# Altium footprint library 3M THD.PcbLib: 163 footprints (part 7 of 14) (continued)
## 3M_N3428-5202RB_a [mm] "3M, 3000 Series, 20 Contacts - Pitch 2.54mm - Right Angle Four-Wall Header (Black) With Short Roll Pin Latch/Ejectors" (continued)
Mechanical 14:
  circle w0.1: c-17.335,0.533 r1.27
  circle w0.1: c17.336,0.533 r1.27
  circle w0.1: c17.018,6.375 r0.787
  circle w0.1: c-17.018,6.375 r0.787
  lines w0.1: -19.837,-2.007 -19.837,1.978 -17.335,3.422 -14.833,1.978 -14.833,-2.007 ; -18.339,14.249 -18.339,22.024 -18.186,22.112 -13.081,19.164 -13.081,15.799 -13.182,15.697 -18.339,15.697 ; -15.113,14.757 -15.113,20.337 ; -12.694,11.201 -11.424,9.002 -10.887,9.931 ; -11.119,11.201 -11.119,9.931 -9.201,9.931 -9.207,11.201 ; -2.032,5.105 2.032,5.105 ; -2.032,11.201 -2.032,3.581 2.032,3.581 2.032,11.201 ; -1.587,5.105 -1.587,11.201 ; -0.952,5.105 -0.952,11.201 ; 0.953,5.105 0.953,11.201 ; 1.588,5.105 1.588,11.201 ; 6.668,11.201 6.661,9.931 8.579,9.931 8.573,11.201 ; 14.834,-2.007 14.834,1.978 17.336,3.422 19.838,1.978 19.838,-2.007 ; 15.12,20.342 15.137,14.757 ; 18.339,14.249 18.339,22.024 18.187,22.112 13.081,19.164 13.081,15.799 13.183,15.697 18.339,15.697 ; -22.352,-2.007 22.352,-2.007 22.352,5.105 19.024,14.249 18.182,14.249 cw(c17.018,14.757) 15.748,14.757 14.906,14.757 14.464,12.251 cw(c13.214,12.471) 13.214,11.201 -13.213,11.201 cw(c-13.213,12.471) -14.464,12.251 -14.906,14.757 -15.748,14.757 cw(c-17.018,14.757) -18.182,14.249 -19.024,14.249 -22.352,5.105 -22.352,-2.007
  text "1" at -13.462,-1.7 h1.02
  text "20" at 12.69,0.889 h1.02
3D body "3M_N3428-5202RB_a.stp": height 8.64, standoff -2.84, extent -22.352,-2.514 22.352,22.125

## 3M_N3428-5302RB [mm] "3M, 3000 Series, 20 Contacts - Pitch 2.54mm - Right Angle Four-Wall Header (Black) With Long Roll Pin Latch/Ejectors"
height 8.6
pads (22):
  round 1.6 hole 0.9: 1(-11.43,-1.27) 2(-11.43,1.27) 3(-8.89,-1.27) 4(-8.89,1.27) 5(-6.35,-1.27) 6(-6.35,1.27) 7(-3.81,-1.27) 8(-3.81,1.27) 9(-1.27,-1.27) 10(-1.27,1.27) 11(1.27,-1.27) 12(1.27,1.27) 13(3.81,-1.27) 14(3.81,1.27) 15(6.35,-1.27) 16(6.35,1.27) 17(8.89,-1.27) 18(8.89,1.27) 19(11.43,-1.27) 20(11.43,1.27)
  round 4.6 hole 2.8: MTG1(-17.335,0.533) MTG2(17.336,0.533)
Top Overlay:
  circle w0.2: c17.018,6.375 r0.787
  circle w0.2: c-17.018,6.375 r0.787
  circle w0.3: c-11.503,-3.048 r0.15
  lines w0.2: -30.354,16.275 -20.393,10.488 ; -27.949,11.162 -25.371,15.627 -25.408,15.766 -28.322,17.449 -33.428,14.501 -33.428,14.325 -24.241,9.02 -22.038,5.969 ; -19.24,-2.007 -22.352,-2.007 -22.352,5.105 -19.024,14.249 -18.182,14.249 ccw(c-17.018,14.757) -15.748,14.757 -14.906,14.757 -14.464,12.251 ccw(c-13.213,12.471) -13.213,11.201 13.213,11.201 ccw(c13.213,12.471) 14.464,12.251 14.906,14.757 15.748,14.757 ccw(c17.018,14.757) 18.182,14.249 19.024,14.249 22.352,5.105 22.352,-2.007 19.24,-2.007 ; -12.694,11.201 -11.424,9.002 -10.887,9.931 ; -11.119,11.201 -11.119,9.931 -9.201,9.931 -9.207,11.201 ; -2.032,5.105 2.032,5.105 ; -2.032,11.201 -2.032,3.581 2.032,3.581 2.032,11.201 ; -1.587,5.105 -1.587,11.201 ; -0.952,5.105 -0.952,11.201 ; 0.953,5.105 0.953,11.201 ; 1.588,5.105 1.588,11.201 ; 6.668,11.201 6.661,9.931 8.579,9.931 8.573,11.201 ; 20.393,10.488 30.354,16.275 ; 22.038,5.969 24.241,9.02 33.428,14.325 ; 27.949,11.162 25.371,15.627 25.408,15.766 28.322,17.449 33.428,14.501
  text "1" at -13.462,-1.7 h1.02
  text "20" at 12.69,0.889 h1.02
Mechanical 8:
  lines w0.1: -18.335,0.533 -17.335,0.533 ; -17.335,-0.467 -17.335,0.533 ; -17.335,1.533 -17.335,0.533 ; -16.335,0.533 -17.335,0.533 ; -12.43,-1.27 -11.43,-1.27 ; -12.43,1.27 -11.43,1.27 ; -11.43,-2.27 -11.43,-1.27 ; -11.43,-0.27 -11.43,-1.27 ; -11.43,0.27 -11.43,1.27 ; -11.43,2.27 -11.43,1.27 ; -10.43,-1.27 -11.43,-1.27 ; -10.43,1.27 -11.43,1.27 ; -9.89,-1.27 -8.89,-1.27 ; -9.89,1.27 -8.89,1.27 ; -8.89,-2.27 -8.89,-1.27 ; -8.89,-0.27 -8.89,-1.27 ; -8.89,0.27 -8.89,1.27 ; -8.89,2.27 -8.89,1.27 ; -7.89,-1.27 -8.89,-1.27 ; -7.89,1.27 -8.89,1.27 ; -7.35,-1.27 -6.35,-1.27 ; -7.35,1.27 -6.35,1.27 ; -6.35,-2.27 -6.35,-1.27 ; -6.35,-0.27 -6.35,-1.27 ; -6.35,0.27 -6.35,1.27 ; -6.35,2.27 -6.35,1.27 ; -5.35,-1.27 -6.35,-1.27 ; -5.35,1.27 -6.35,1.27 ; -4.81,-1.27 -3.81,-1.27 ; -4.81,1.27 -3.81,1.27 ; -3.81,-2.27 -3.81,-1.27 ; -3.81,-0.27 -3.81,-1.27 ; -3.81,0.27 -3.81,1.27 ; -3.81,2.27 -3.81,1.27 ; -2.81,-1.27 -3.81,-1.27 ; -2.81,1.27 -3.81,1.27 ; -2.27,-1.27 -1.27,-1.27 ; -2.27,1.27 -1.27,1.27 ; -1.27,-2.27 -1.27,-1.27 ; -1.27,-0.27 -1.27,-1.27 ; -1.27,0.27 -1.27,1.27 ; -1.27,2.27 -1.27,1.27 ; -1,0 0,0 ; -0.27,-1.27 -1.27,-1.27 ; -0.27,1.27 -1.27,1.27 ; 0,-1 0,0 ; 0,1 0,0 ; 0.27,-1.27 1.27,-1.27 ; 0.27,1.27 1.27,1.27 ; 1,0 0,0 ; 1.27,-2.27 1.27,-1.27 ; 1.27,-0.27 1.27,-1.27 ; 1.27,0.27 1.27,1.27 ; 1.27,2.27 1.27,1.27 ; 2.27,-1.27 1.27,-1.27 ; 2.27,1.27 1.27,1.27 ; 2.81,-1.27 3.81,-1.27 ; 2.81,1.27 3.81,1.27 ; 3.81,-2.27 3.81,-1.27 ; 3.81,-0.27 3.81,-1.27 ; 3.81,0.27 3.81,1.27 ; 3.81,2.27 3.81,1.27 ; 4.81,-1.27 3.81,-1.27 ; 4.81,1.27 3.81,1.27 ; 5.35,-1.27 6.35,-1.27 ; 5.35,1.27 6.35,1.27 ; 6.35,-2.27 6.35,-1.27 ; 6.35,-0.27 6.35,-1.27 ; 6.35,0.27 6.35,1.27 ; 6.35,2.27 6.35,1.27 ; 7.35,-1.27 6.35,-1.27 ; 7.35,1.27 6.35,1.27 ; 7.89,-1.27 8.89,-1.27 ; 7.89,1.27 8.89,1.27 ; 8.89,-2.27 8.89,-1.27 ; 8.89,-0.27 8.89,-1.27 ; 8.89,0.27 8.89,1.27 ; 8.89,2.27 8.89,1.27 ; 9.89,-1.27 8.89,-1.27 ; 9.89,1.27 8.89,1.27 ; 10.43,-1.27 11.43,-1.27 ; 10.43,1.27 11.43,1.27 ; 11.43,-2.27 11.43,-1.27 ; 11.43,-0.27 11.43,-1.27 ; 11.43,0.27 11.43,1.27 ; 11.43,2.27 11.43,1.27 ; 12.43,-1.27 11.43,-1.27 ; 12.43,1.27 11.43,1.27 ; 16.336,0.533 17.336,0.533 ; 17.336,-0.467 17.336,0.533 ; 17.336,1.533 17.336,0.533 ; 18.336,0.533 17.336,0.533
Mechanical 14:
  circle w0.1: c-17.335,0.533 r1.27
  circle w0.1: c17.336,0.533 r1.27
  circle w0.1: c17.018,6.375 r0.787
  circle w0.1: c-17.018,6.375 r0.787
  lines w0.1: -30.354,16.275 -20.393,10.488 ; -27.949,11.162 -25.371,15.627 -25.408,15.766 -28.322,17.449 -33.428,14.501 -33.428,14.325 -24.241,9.02 -22.038,5.969 ; -19.837,-2.007 -19.837,1.978 -17.335,3.422 -14.834,1.978 -14.834,-2.007 ; -12.694,11.201 -11.424,9.002 -10.887,9.931 ; -11.119,11.201 -11.119,9.931 -9.201,9.931 -9.207,11.201 ; -2.032,5.105 2.032,5.105 ; -2.032,11.201 -2.032,3.581 2.032,3.581 2.032,11.201 ; -1.587,5.105 -1.587,11.201 ; -0.952,5.105 -0.952,11.201 ; 0.953,5.105 0.953,11.201 ; 1.588,5.105 1.588,11.201 ; 6.668,11.201 6.661,9.931 8.579,9.931 8.573,11.201 ; 14.834,-2.007 14.834,1.978 17.336,3.422 19.837,1.978 19.837,-2.007 ; 20.393,10.488 30.354,16.275 ; 22.038,5.969 24.241,9.02 33.428,14.325 ; 27.949,11.162 25.371,15.627 25.408,15.766 28.322,17.449 33.428,14.501 ; -22.352,-2.007 22.352,-2.007 22.352,5.105 19.024,14.249 18.182,14.249 cw(c17.018,14.757) 15.748,14.757 14.906,14.757 14.464,12.251 cw(c13.213,12.471) 13.213,11.201 -13.213,11.201 cw(c-13.213,12.471) -14.464,12.251 -14.906,14.757 -15.748,14.757 cw(c-17.018,14.757) -18.182,14.249 -19.024,14.249 -22.352,5.105 -22.352,-2.007
  text "1" at -13.462,-1.7 h1.02
  text "20" at 12.69,0.889 h1.02
3D body "3M_N3428-5302RB.stp": height 8.64, standoff -2.84, extent -33.478,-2.514 33.479,17.448

## 3M_N3428-5302RB_a [mm] "3M, 3000 Series, 20 Contacts - Pitch 2.54mm - Right Angle Four-Wall Header (Black) With Long Roll Pin Latch/Ejectors"
height 8.6
pads (22):
  round 1.6 hole 0.9: 1(-11.43,-1.27) 2(-11.43,1.27) 3(-8.89,-1.27) 4(-8.89,1.27) 5(-6.35,-1.27) 6(-6.35,1.27) 7(-3.81,-1.27) 8(-3.81,1.27) 9(-1.27,-1.27) 10(-1.27,1.27) 11(1.27,-1.27) 12(1.27,1.27) 13(3.81,-1.27) 14(3.81,1.27) 15(6.35,-1.27) 16(6.35,1.27) 17(8.89,-1.27) 18(8.89,1.27) 19(11.43,-1.27) 20(11.43,1.27)
  round 4.6 hole 2.8: MTG1(-17.335,0.533) MTG2(17.336,0.533)
Top Overlay:
  circle w0.2: c17.018,6.375 r0.787
  circle w0.2: c-17.018,6.375 r0.787
  circle w0.3: c-11.503,-3.048 r0.15
  lines w0.2: -19.24,-2.007 -22.352,-2.007 -22.352,5.105 -19.024,14.25 -18.182,14.25 ccw(c-17.018,14.758) -15.748,14.758 -14.906,14.758 -14.464,12.251 ccw(c-13.213,12.472) -13.213,11.202 13.214,11.202 ccw(c13.214,12.472) 14.464,12.251 14.906,14.758 15.748,14.758 ccw(c17.018,14.758) 18.182,14.25 19.024,14.25 22.352,5.105 22.352,-2.007 19.24,-2.007 ; -18.339,14.25 -18.339,24.561 -18.186,24.649 -13.081,21.702 -13.081,18.336 -13.182,18.235 -18.339,18.235 ; -15.113,14.758 -15.113,22.875 ; -12.694,11.202 -11.424,9.002 -10.887,9.932 ; -11.119,11.202 -11.119,9.932 -9.201,9.932 -9.207,11.202 ; -2.032,5.105 2.032,5.105 ; -2.032,11.202 -2.032,3.581 2.032,3.581 2.032,11.202 ; -1.587,5.105 -1.587,11.202 ; -0.952,5.105 -0.952,11.202 ; 0.953,5.105 0.953,11.202 ; 1.588,5.105 1.588,11.202 ; 6.668,11.202 6.661,9.932 8.579,9.932 8.573,11.202 ; 15.113,22.875 15.137,14.758 ; 18.339,14.25 18.339,24.561 18.187,24.649 13.081,21.702 13.081,18.336 13.183,18.235 18.339,18.235
  text "1" at -13.462,-1.7 h1.02
  text "20" at 12.69,0.889 h1.02
Mechanical 8:
  lines w0.1: -18.335,0.533 -17.335,0.533 ; -17.335,-0.467 -17.335,0.533 ; -17.335,1.533 -17.335,0.533 ; -16.335,0.533 -17.335,0.533 ; -12.43,-1.27 -11.43,-1.27 ; -12.43,1.27 -11.43,1.27 ; -11.43,-2.27 -11.43,-1.27 ; -11.43,-0.27 -11.43,-1.27 ; -11.43,0.27 -11.43,1.27 ; -11.43,2.27 -11.43,1.27 ; -10.43,-1.27 -11.43,-1.27 ; -10.43,1.27 -11.43,1.27 ; -9.89,-1.27 -8.89,-1.27 ; -9.89,1.27 -8.89,1.27 ; -8.89,-2.27 -8.89,-1.27 ; -8.89,-0.27 -8.89,-1.27 ; -8.89,0.27 -8.89,1.27 ; -8.89,2.27 -8.89,1.27 ; -7.89,-1.27 -8.89,-1.27 ; -7.89,1.27 -8.89,1.27 ; -7.35,-1.27 -6.35,-1.27 ; -7.35,1.27 -6.35,1.27 ; -6.35,-2.27 -6.35,-1.27 ; -6.35,-0.27 -6.35,-1.27 ; -6.35,0.27 -6.35,1.27 ; -6.35,2.27 -6.35,1.27 ; -5.35,-1.27 -6.35,-1.27 ; -5.35,1.27 -6.35,1.27 ; -4.81,-1.27 -3.81,-1.27 ; -4.81,1.27 -3.81,1.27 ; -3.81,-2.27 -3.81,-1.27 ; -3.81,-0.27 -3.81,-1.27 ; -3.81,0.27 -3.81,1.27 ; -3.81,2.27 -3.81,1.27 ; -2.81,-1.27 -3.81,-1.27 ; -2.81,1.27 -3.81,1.27 ; -2.27,-1.27 -1.27,-1.27 ; -2.27,1.27 -1.27,1.27 ; -1.27,-2.27 -1.27,-1.27 ; -1.27,-0.27 -1.27,-1.27 ; -1.27,0.27 -1.27,1.27 ; -1.27,2.27 -1.27,1.27 ; -1,0 0,0 ; -0.27,-1.27 -1.27,-1.27 ; -0.27,1.27 -1.27,1.27 ; 0,-1 0,0 ; 0,1 0,0 ; 0.27,-1.27 1.27,-1.27 ; 0.27,1.27 1.27,1.27 ; 1,0 0,0 ; 1.27,-2.27 1.27,-1.27 ; 1.27,-0.27 1.27,-1.27 ; 1.27,0.27 1.27,1.27 ; 1.27,2.27 1.27,1.27 ; 2.27,-1.27 1.27,-1.27 ; 2.27,1.27 1.27,1.27 ; 2.81,-1.27 3.81,-1.27 ; 2.81,1.27 3.81,1.27 ; 3.81,-2.27 3.81,-1.27 ; 3.81,-0.27 3.81,-1.27 ; 3.81,0.27 3.81,1.27 ; 3.81,2.27 3.81,1.27 ; 4.81,-1.27 3.81,-1.27 ; 4.81,1.27 3.81,1.27 ; 5.35,-1.27 6.35,-1.27 ; 5.35,1.27 6.35,1.27 ; 6.35,-2.27 6.35,-1.27 ; 6.35,-0.27 6.35,-1.27 ; 6.35,0.27 6.35,1.27 ; 6.35,2.27 6.35,1.27 ; 7.35,-1.27 6.35,-1.27 ; 7.35,1.27 6.35,1.27 ; 7.89,-1.27 8.89,-1.27 ; 7.89,1.27 8.89,1.27 ; 8.89,-2.27 8.89,-1.27 ; 8.89,-0.27 8.89,-1.27 ; 8.89,0.27 8.89,1.27 ; 8.89,2.27 8.89,1.27 ; 9.89,-1.27 8.89,-1.27 ; 9.89,1.27 8.89,1.27 ; 10.43,-1.27 11.43,-1.27 ; 10.43,1.27 11.43,1.27 ; 11.43,-2.27 11.43,-1.27 ; 11.43,-0.27 11.43,-1.27 ; 11.43,0.27 11.43,1.27 ; 11.43,2.27 11.43,1.27 ; 12.43,-1.27 11.43,-1.27 ; 12.43,1.27 11.43,1.27 ; 16.336,0.533 17.336,0.533 ; 17.336,-0.467 17.336,0.533 ; 17.336,1.533 17.336,0.533 ; 18.336,0.533 17.336,0.533
Mechanical 14:
  circle w0.1: c-17.335,0.533 r1.27
  circle w0.1: c17.336,0.533 r1.27
  circle w0.1: c17.018,6.375 r0.787
  circle w0.1: c-17.018,6.375 r0.787
  lines w0.1: -19.837,-2.007 -19.837,1.978 -17.335,3.422 -14.833,1.978 -14.833,-2.007 ; -18.339,14.25 -18.339,24.562 -18.186,24.65 -13.081,21.702 -13.081,18.337 -13.182,18.235 -18.339,18.235 ; -15.113,14.758 -15.113,22.875 ; -12.694,11.202 -11.424,9.002 -10.887,9.932 ; -11.119,11.202 -11.119,9.932 -9.201,9.932 -9.207,11.202 ; -2.032,5.105 2.032,5.105 ; -2.032,11.202 -2.032,3.581 2.032,3.581 2.032,11.202 ; -1.587,5.105 -1.587,11.202 ; -0.952,5.105 -0.952,11.202 ; 0.953,5.105 0.953,11.202 ; 1.588,5.105 1.588,11.202 ; 6.668,11.202 6.661,9.932 8.579,9.932 8.573,11.202 ; 14.834,-2.007 14.834,1.978 17.336,3.422 19.838,1.978 19.838,-2.007 ; 15.113,22.875 15.137,14.758 ; 18.339,14.25 18.339,24.562 18.187,24.65 13.081,21.702 13.081,18.337 13.183,18.235 18.339,18.235 ; -22.352,-2.007 22.352,-2.007 22.352,5.105 19.024,14.25 18.182,14.25 cw(c17.018,14.758) 15.748,14.758 14.906,14.758 14.464,12.251 cw(c13.214,12.472) 13.214,11.202 -13.213,11.202 cw(c-13.213,12.472) -14.464,12.251 -14.906,14.758 -15.748,14.758 cw(c-17.018,14.758) -18.182,14.25 -19.024,14.25 -22.352,5.105 -22.352,-2.007
  text "1" at -13.462,-1.7 h1.02
  text "20" at 12.69,0.889 h1.02
3D body "3M_N3428-5302RB_a.stp": height 8.64, standoff -2.84, extent -22.352,-2.514 22.352,24.663

## 3M_N3428-6202RB [mm] "3M, 3000 Series, 20 Contacts - Pitch 2.54mm - Straight Four-Wall Header (Black) With Short Roll Pin Latch/Ejectors"
height 24.6
pads (22):
  round 1.6 hole 0.9: 1(-11.43,-1.27) 2(-11.43,1.27) 3(-8.89,-1.27) 4(-8.89,1.27) 5(-6.35,-1.27) 6(-6.35,1.27) 7(-3.81,-1.27) 8(-3.81,1.27) 9(-1.27,-1.27) 10(-1.27,1.27) 11(1.27,-1.27) 12(1.27,1.27) 13(3.81,-1.27) 14(3.81,1.27) 15(6.35,-1.27) 16(6.35,1.27) 17(8.89,-1.27) 18(8.89,1.27) 19(11.43,-1.27) 20(11.43,1.27)
  round 4.6 hole 2.8: MTG1(-20.384,-0.254) MTG2(20.384,-0.254)
Top Overlay:
  lines w0.2: -22.352,-2 -22.352,-4.318 22.352,-4.318 22.352,-2 ; -22.352,1.7 -22.352,4.3 ; -22.352,4.318 22.352,4.318 ; -12.7,-3.175 -11.43,-4.318 -10.16,-3.175 ; -2.032,-4.318 -2.032,-3.175 ; 2.032,-4.318 2.032,-3.175 ; 22.352,1.7 22.352,4.3 ; -15.367,-3.175 -15.367,3.175 15.367,3.175 15.367,-3.175 -15.367,-3.175
  text "20" at 12.665,1.727 h1.02
  text "1" at -13.767,-2.871 h1.02
Mechanical 14:
  circle w0.1: c20.384,-0.254 r1.27
  circle w0.1: c-20.384,-0.254 r1.27
  lines w0.1: -22.352,-3.175 -19.024,-3.175 ; -21.384,-0.254 -20.384,-0.254 ; -20.384,-1.254 -20.384,-0.254 ; -20.384,0.746 -20.384,-0.254 ; -19.384,-0.254 -20.384,-0.254 ; -19.024,-4.318 -19.024,-1.727 -12.065,-1.727 -12.065,1.27 -19.024,1.27 -19.024,4.318 ; -18.182,-4.318 -18.182,-1.727 ; -18.182,1.27 -18.182,4.318 ; -15.749,-4.318 -15.748,-1.727 ; -15.367,-1.727 -15.367,-3.175 15.367,-3.175 15.367,-1.727 ; -15.367,1.27 -15.367,3.175 15.367,3.175 15.367,1.27 ; -2.032,-4.318 -2.032,-3.175 ; 2.032,-4.318 2.032,-3.175 ; 14.906,-4.318 14.906,-3.175 ; 14.906,3.175 14.906,4.318 ; 15.748,1.27 15.748,4.318 ; 15.789,-4.318 15.789,-1.727 ; 18.182,-4.318 18.182,-1.727 ; 18.182,1.27 18.182,4.318 ; 19.024,-4.318 19.024,-1.727 12.065,-1.727 12.065,1.27 19.024,1.27 19.024,4.318 ; 19.024,-3.175 22.352,-3.175 ; 19.024,3.175 22.352,3.175 ; 19.384,-0.254 20.384,-0.254 ; 20.384,-1.254 20.384,-0.254 ; 20.384,0.746 20.384,-0.254 ; 21.384,-0.254 20.384,-0.254 ; -22.352,-4.318 -22.352,4.318 22.352,4.318 22.352,-4.318 -22.352,-4.318 ; -22.352,3.175 -19.024,3.175 -22.352,3.175 ; -21.908,-1.134 -20.384,-2.014 -18.86,-1.134 -18.86,0.626 -20.384,1.506 -21.908,0.626 -21.908,-1.134 ; -15.748,1.27 -15.748,4.318 -15.748,1.27 ; -14.906,-4.318 -14.906,-3.175 -14.906,-4.318 ; -14.906,3.175 -14.906,4.318 -14.906,3.175 ; -12.7,-3.175 -10.16,-3.175 -11.43,-4.318 -12.7,-3.175 ; 18.86,-1.134 20.384,-2.014 21.908,-1.134 21.908,0.626 20.384,1.506 18.86,0.626 18.86,-1.134
  text "1" at -13.767,-2.871 h1.02
  text "20" at 12.665,1.727 h1.02
3D body "3M_N3428-6202RB.stp": height 18.69, standoff -2.84, extent -31.281,-4.318 31.281,4.318

## 3M_N3428-6202RB_a [mm] "3M, 3000 Series, 20 Contacts - Pitch 2.54mm - Straight Four-Wall Header (Black) With Short Roll Pin Latch/Ejectors"
height 24.6
pads (22):
  round 1.6 hole 0.9: 1(-11.43,-1.27) 2(-11.43,1.27) 3(-8.89,-1.27) 4(-8.89,1.27) 5(-6.35,-1.27) 6(-6.35,1.27) 7(-3.81,-1.27) 8(-3.81,1.27) 9(-1.27,-1.27) 10(-1.27,1.27) 11(1.27,-1.27) 12(1.27,1.27) 13(3.81,-1.27) 14(3.81,1.27) 15(6.35,-1.27) 16(6.35,1.27) 17(8.89,-1.27) 18(8.89,1.27) 19(11.43,-1.27) 20(11.43,1.27)
  round 4.6 hole 2.8: MTG1(-20.384,-0.254) MTG2(20.384,-0.254)
Top Overlay:
  lines w0.2: -22.352,-2 -22.352,-4.318 22.352,-4.318 22.352,-2 ; -22.352,1.7 -22.352,4.3 ; -22.352,4.318 22.352,4.318 ; -12.7,-3.175 -11.43,-4.318 -10.16,-3.175 ; -2.032,-4.318 -2.032,-3.175 ; 2.032,-4.318 2.032,-3.175 ; 22.352,1.7 22.352,4.3 ; -15.367,-3.175 -15.367,3.175 15.367,3.175 15.367,-3.175 -15.367,-3.175
  text "20" at 12.665,1.727 h1.02
  text "1" at -13.767,-2.871 h1.02
Mechanical 14:
  circle w0.1: c20.384,-0.254 r1.27
  circle w0.1: c-20.384,-0.254 r1.27
  lines w0.1: -22.352,-3.175 -19.024,-3.175 ; -21.384,-0.254 -20.384,-0.254 ; -20.384,-1.254 -20.384,-0.254 ; -20.384,0.746 -20.384,-0.254 ; -19.384,-0.254 -20.384,-0.254 ; -19.024,-4.318 -19.024,-1.727 -12.065,-1.727 -12.065,1.27 -19.024,1.27 -19.024,4.318 ; -18.182,-4.318 -18.182,-1.727 ; -18.182,1.27 -18.182,4.318 ; -15.749,-4.318 -15.748,-1.727 ; -15.367,-1.727 -15.367,-3.175 15.367,-3.175 15.367,-1.727 ; -15.367,1.27 -15.367,3.175 15.367,3.175 15.367,1.27 ; -2.032,-4.318 -2.032,-3.175 ; 2.032,-4.318 2.032,-3.175 ; 14.906,-4.318 14.906,-3.175 ; 14.906,3.175 14.906,4.318 ; 15.748,1.27 15.748,4.318 ; 15.789,-4.318 15.789,-1.727 ; 18.182,-4.318 18.182,-1.727 ; 18.182,1.27 18.182,4.318 ; 19.024,-4.318 19.024,-1.727 12.065,-1.727 12.065,1.27 19.024,1.27 19.024,4.318 ; 19.024,-3.175 22.352,-3.175 ; 19.024,3.175 22.352,3.175 ; 19.384,-0.254 20.384,-0.254 ; 20.384,-1.254 20.384,-0.254 ; 20.384,0.746 20.384,-0.254 ; 21.384,-0.254 20.384,-0.254 ; -22.352,-4.318 -22.352,4.318 22.352,4.318 22.352,-4.318 -22.352,-4.318 ; -22.352,3.175 -19.024,3.175 -22.352,3.175 ; -21.908,-1.134 -20.384,-2.014 -18.86,-1.134 -18.86,0.626 -20.384,1.506 -21.908,0.626 -21.908,-1.134 ; -15.748,1.27 -15.748,4.318 -15.748,1.27 ; -14.906,-4.318 -14.906,-3.175 -14.906,-4.318 ; -14.906,3.175 -14.906,4.318 -14.906,3.175 ; -12.7,-3.175 -10.16,-3.175 -11.43,-4.318 -12.7,-3.175 ; 18.86,-1.134 20.384,-2.014 21.908,-1.134 21.908,0.626 20.384,1.506 18.86,0.626 18.86,-1.134
  text "1" at -13.767,-2.871 h1.02
  text "20" at 12.665,1.727 h1.02
3D body "3M_N3428-6202RB_a.stp": height 24.64, standoff -2.84, extent -22.352,-4.318 22.352,4.318

## 3M_N3428-6203RB [mm] "20 Contacts - Straight .100'' x .100'' Low Profile Black Four-Wall Header (Short Roll Pin Latch/Ejectors), (Solder Tail 3.94mm), 3000 Series"
height 24.6
pads (22):
  round 1.6 hole 0.9: 1(-11.43,-1.27) 2(-11.43,1.27) 3(-8.89,-1.27) 4(-8.89,1.27) 5(-6.35,-1.27) 6(-6.35,1.27) 7(-3.81,-1.27) 8(-3.81,1.27) 9(-1.27,-1.27) 10(-1.27,1.27) 11(1.27,-1.27) 12(1.27,1.27) 13(3.81,-1.27) 14(3.81,1.27) 15(6.35,-1.27) 16(6.35,1.27) 17(8.89,-1.27) 18(8.89,1.27) 19(11.43,-1.27) 20(11.43,1.27)
  round 4.6 hole 2.8: MTG1(-20.384,-0.254) MTG2(20.384,-0.254)
Top Overlay:
  lines w0.2: -22.352,-2 -22.352,-4.318 22.352,-4.318 22.352,-2 ; -22.352,1.7 -22.352,4.3 ; -22.352,4.318 22.352,4.318 ; -12.7,-3.175 -11.43,-4.318 -10.16,-3.175 ; -2.032,-4.318 -2.032,-3.175 ; 2.032,-4.318 2.032,-3.175 ; 22.352,1.7 22.352,4.3 ; -15.367,-3.175 15.367,-3.175 15.367,3.175 -15.367,3.175 -15.367,-3.175
  text "1" at -13.767,-2.871 h1.02
  text "20" at 12.665,1.727 h1.02
Mechanical 14:
  circle w0.1: c-20.384,-0.254 r1.27
  circle w0.1: c20.384,-0.254 r1.27
  lines w0.1: -22.352,-3.175 -19.024,-3.175 ; -21.384,-0.254 -20.384,-0.254 ; -20.384,-1.254 -20.384,-0.254 ; -20.384,0.746 -20.384,-0.254 ; -19.384,-0.254 -20.384,-0.254 ; -19.024,-4.318 -19.024,-1.727 -12.065,-1.727 -12.065,1.27 -19.024,1.27 -19.024,4.318 ; -18.182,-4.318 -18.182,-1.727 ; -18.182,1.27 -18.182,4.318 ; -15.749,-4.318 -15.748,-1.727 ; -15.367,-1.727 -15.367,-3.175 15.367,-3.175 15.367,-1.727 ; -15.367,1.27 -15.367,3.175 15.367,3.175 15.367,1.27 ; -2.032,-4.318 -2.032,-3.175 ; 2.032,-4.318 2.032,-3.175 ; 14.906,-4.318 14.906,-3.175 ; 14.906,3.175 14.906,4.318 ; 15.748,1.27 15.748,4.318 ; 15.789,-4.318 15.789,-1.727 ; 18.182,-4.318 18.182,-1.727 ; 18.182,1.27 18.182,4.318 ; 19.024,-4.318 19.024,-1.727 12.065,-1.727 12.065,1.27 19.024,1.27 19.024,4.318 ; 19.024,-3.175 22.352,-3.175 ; 19.024,3.175 22.352,3.175 ; 19.384,-0.254 20.384,-0.254 ; 20.384,-1.254 20.384,-0.254 ; 20.384,0.746 20.384,-0.254 ; 21.384,-0.254 20.384,-0.254 ; -22.352,-4.318 22.352,-4.318 22.352,4.318 -22.352,4.318 -22.352,-4.318 ; -22.352,3.175 -19.024,3.175 -22.352,3.175 ; -21.908,-1.134 -21.908,0.626 -20.384,1.506 -18.86,0.626 -18.86,-1.134 -20.384,-2.014 -21.908,-1.134 ; -15.748,1.27 -15.748,4.318 -15.748,1.27 ; -14.906,-4.318 -14.906,-3.175 -14.906,-4.318 ; -14.906,3.175 -14.906,4.318 -14.906,3.175 ; -12.7,-3.175 -11.43,-4.318 -10.16,-3.175 -12.7,-3.175 ; 18.86,-1.134 18.86,0.626 20.384,1.506 21.908,0.626 21.908,-1.134 20.384,-2.014 18.86,-1.134
  text "20" at 12.665,1.727 h1.02
  text "1" at -13.767,-2.871 h1.02
3D body "3M_N3428-6203RB.stp": height 18.69, standoff -3.94, extent -31.281,-4.318 31.281,4.318

## 3M_N3428-6203RB_a [mm] "20 Contacts - Straight .100'' x .100'' Low Profile Black Four-Wall Header (Short Roll Pin Latch/Ejectors), (Solder Tail 3.94mm), 3000 Series"
height 24.6
pads (22):
  round 1.6 hole 0.9: 1(-11.43,-1.27) 2(-11.43,1.27) 3(-8.89,-1.27) 4(-8.89,1.27) 5(-6.35,-1.27) 6(-6.35,1.27) 7(-3.81,-1.27) 8(-3.81,1.27) 9(-1.27,-1.27) 10(-1.27,1.27) 11(1.27,-1.27) 12(1.27,1.27) 13(3.81,-1.27) 14(3.81,1.27) 15(6.35,-1.27) 16(6.35,1.27) 17(8.89,-1.27) 18(8.89,1.27) 19(11.43,-1.27) 20(11.43,1.27)
  round 4.6 hole 2.8: MTG1(-20.384,-0.254) MTG2(20.384,-0.254)
Top Overlay:
  lines w0.2: -22.352,-2 -22.352,-4.318 22.352,-4.318 22.352,-2 ; -22.352,1.7 -22.352,4.3 ; -22.352,4.318 22.352,4.318 ; -12.7,-3.175 -11.43,-4.318 -10.16,-3.175 ; -2.032,-4.318 -2.032,-3.175 ; 2.032,-4.318 2.032,-3.175 ; 22.352,1.7 22.352,4.3 ; -15.367,-3.175 15.367,-3.175 15.367,3.175 -15.367,3.175 -15.367,-3.175
  text "1" at -13.767,-2.871 h1.02
  text "20" at 12.665,1.727 h1.02
Mechanical 14:
  circle w0.1: c-20.384,-0.254 r1.27
  circle w0.1: c20.384,-0.254 r1.27
  lines w0.1: -22.352,-3.175 -19.024,-3.175 ; -21.384,-0.254 -20.384,-0.254 ; -20.384,-1.254 -20.384,-0.254 ; -20.384,0.746 -20.384,-0.254 ; -19.384,-0.254 -20.384,-0.254 ; -19.024,-4.318 -19.024,-1.727 -12.065,-1.727 -12.065,1.27 -19.024,1.27 -19.024,4.318 ; -18.182,-4.318 -18.182,-1.727 ; -18.182,1.27 -18.182,4.318 ; -15.749,-4.318 -15.748,-1.727 ; -15.367,-1.727 -15.367,-3.175 15.367,-3.175 15.367,-1.727 ; -15.367,1.27 -15.367,3.175 15.367,3.175 15.367,1.27 ; -2.032,-4.318 -2.032,-3.175 ; 2.032,-4.318 2.032,-3.175 ; 14.906,-4.318 14.906,-3.175 ; 14.906,3.175 14.906,4.318 ; 15.748,1.27 15.748,4.318 ; 15.789,-4.318 15.789,-1.727 ; 18.182,-4.318 18.182,-1.727 ; 18.182,1.27 18.182,4.318 ; 19.024,-4.318 19.024,-1.727 12.065,-1.727 12.065,1.27 19.024,1.27 19.024,4.318 ; 19.024,-3.175 22.352,-3.175 ; 19.024,3.175 22.352,3.175 ; 19.384,-0.254 20.384,-0.254 ; 20.384,-1.254 20.384,-0.254 ; 20.384,0.746 20.384,-0.254 ; 21.384,-0.254 20.384,-0.254 ; -22.352,-4.318 22.352,-4.318 22.352,4.318 -22.352,4.318 -22.352,-4.318 ; -22.352,3.175 -19.024,3.175 -22.352,3.175 ; -21.908,-1.134 -21.908,0.626 -20.384,1.506 -18.86,0.626 -18.86,-1.134 -20.384,-2.014 -21.908,-1.134 ; -15.748,1.27 -15.748,4.318 -15.748,1.27 ; -14.906,-4.318 -14.906,-3.175 -14.906,-4.318 ; -14.906,3.175 -14.906,4.318 -14.906,3.175 ; -12.7,-3.175 -11.43,-4.318 -10.16,-3.175 -12.7,-3.175 ; 18.86,-1.134 18.86,0.626 20.384,1.506 21.908,0.626 21.908,-1.134 20.384,-2.014 18.86,-1.134
  text "20" at 12.665,1.727 h1.02
  text "1" at -13.767,-2.871 h1.02
3D body "3M_N3428-6203RB_a.stp": height 24.64, standoff -3.94, extent -22.352,-4.318 22.352,4.318

## 3M_N3428-6302RB [mm] "3M, 3000 Series, 20 Contacts - Pitch 2.54mm - Straight Four-Wall Header (Black) With Long Roll Pin Latch/Ejectors"
height 27.2
pads (22):
  round 1.6 hole 0.9: 1(-11.43,-1.27) 2(-11.43,1.27) 3(-8.89,-1.27) 4(-8.89,1.27) 5(-6.35,-1.27) 6(-6.35,1.27) 7(-3.81,-1.27) 8(-3.81,1.27) 9(-1.27,-1.27) 10(-1.27,1.27) 11(1.27,-1.27) 12(1.27,1.27) 13(3.81,-1.27) 14(3.81,1.27) 15(6.35,-1.27) 16(6.35,1.27) 17(8.89,-1.27) 18(8.89,1.27) 19(11.43,-1.27) 20(11.43,1.27)
  round 4.6 hole 2.8: MTG1(-20.384,-0.254) MTG2(20.384,-0.254)
Top Overlay:
  lines w0.2: -22.352,-2 -22.352,-4.318 22.352,-4.318 22.352,-2 ; -22.352,1.7 -22.352,4.3 ; -22.352,4.318 22.352,4.318 ; -12.7,-3.175 -11.43,-4.318 -10.16,-3.175 ; -2.032,-4.318 -2.032,-3.175 ; 2.032,-4.318 2.032,-3.175 ; 22.352,1.7 22.352,4.3 ; -15.367,-3.175 15.367,-3.175 15.367,3.175 -15.367,3.175 -15.367,-3.175
  text "1" at -13.767,-2.871 h1.02
  text "20" at 12.665,1.727 h1.02
Mechanical 14:
  circle w0.1: c-20.384,-0.254 r1.27
  circle w0.1: c20.384,-0.254 r1.27
  lines w0.1: -22.352,-3.175 -19.024,-3.175 ; -21.384,-0.254 -20.384,-0.254 ; -20.384,-1.254 -20.384,-0.254 ; -20.384,0.746 -20.384,-0.254 ; -19.384,-0.254 -20.384,-0.254 ; -19.024,-4.318 -19.024,-1.727 -12.065,-1.727 -12.065,1.27 -19.024,1.27 -19.024,4.318 ; -18.182,-4.318 -18.182,-1.727 ; -18.182,1.27 -18.182,4.318 ; -15.749,-4.318 -15.748,-1.727 ; -15.367,-1.727 -15.367,-3.175 15.367,-3.175 15.367,-1.727 ; -15.367,1.27 -15.367,3.175 15.367,3.175 15.367,1.27 ; -2.032,-4.318 -2.032,-3.175 ; 2.032,-4.318 2.032,-3.175 ; 14.906,-4.318 14.906,-3.175 ; 14.906,3.175 14.906,4.318 ; 15.748,1.27 15.748,4.318 ; 15.789,-4.318 15.789,-1.727 ; 18.182,-4.318 18.182,-1.727 ; 18.182,1.27 18.182,4.318 ; 19.024,-4.318 19.024,-1.727 12.065,-1.727 12.065,1.27 19.024,1.27 19.024,4.318 ; 19.024,-3.175 22.352,-3.175 ; 19.024,3.175 22.352,3.175 ; 19.384,-0.254 20.384,-0.254 ; 20.384,-1.254 20.384,-0.254 ; 20.384,0.746 20.384,-0.254 ; 21.384,-0.254 20.384,-0.254 ; -22.352,-4.318 22.352,-4.318 22.352,4.318 -22.352,4.318 -22.352,-4.318 ; -22.352,3.175 -19.024,3.175 -22.352,3.175 ; -21.908,-1.134 -21.908,0.626 -20.384,1.506 -18.86,0.626 -18.86,-1.134 -20.384,-2.014 -21.908,-1.134 ; -15.748,1.27 -15.748,4.318 -15.748,1.27 ; -14.906,-4.318 -14.906,-3.175 -14.906,-4.318 ; -14.906,3.175 -14.906,4.318 -14.906,3.175 ; -12.7,-3.175 -11.43,-4.318 -10.16,-3.175 -12.7,-3.175 ; 18.86,-1.134 18.86,0.626 20.384,1.506 21.908,0.626 21.908,-1.134 20.384,-2.014 18.86,-1.134
  text "20" at 12.665,1.727 h1.02
  text "1" at -13.767,-2.871 h1.02
3D body "3M_N3428-6302RB.stp": height 19.96, standoff -2.84, extent -33.479,-4.318 33.479,4.318